# Altium footprint library TUNA_AL-CAP_Lib.PcbLib: 133 footprints (part 6 of 9)
Each footprint in its own frame and in the unit in brackets; x right, y up, seen from the top. Pads: shape width x height; smd on the part's side, far side on the other; paste and mask are expansions set on the pad; w line width, h text height; cw(c..) or ccw(c..) is an arc to the next point about the centre after c.
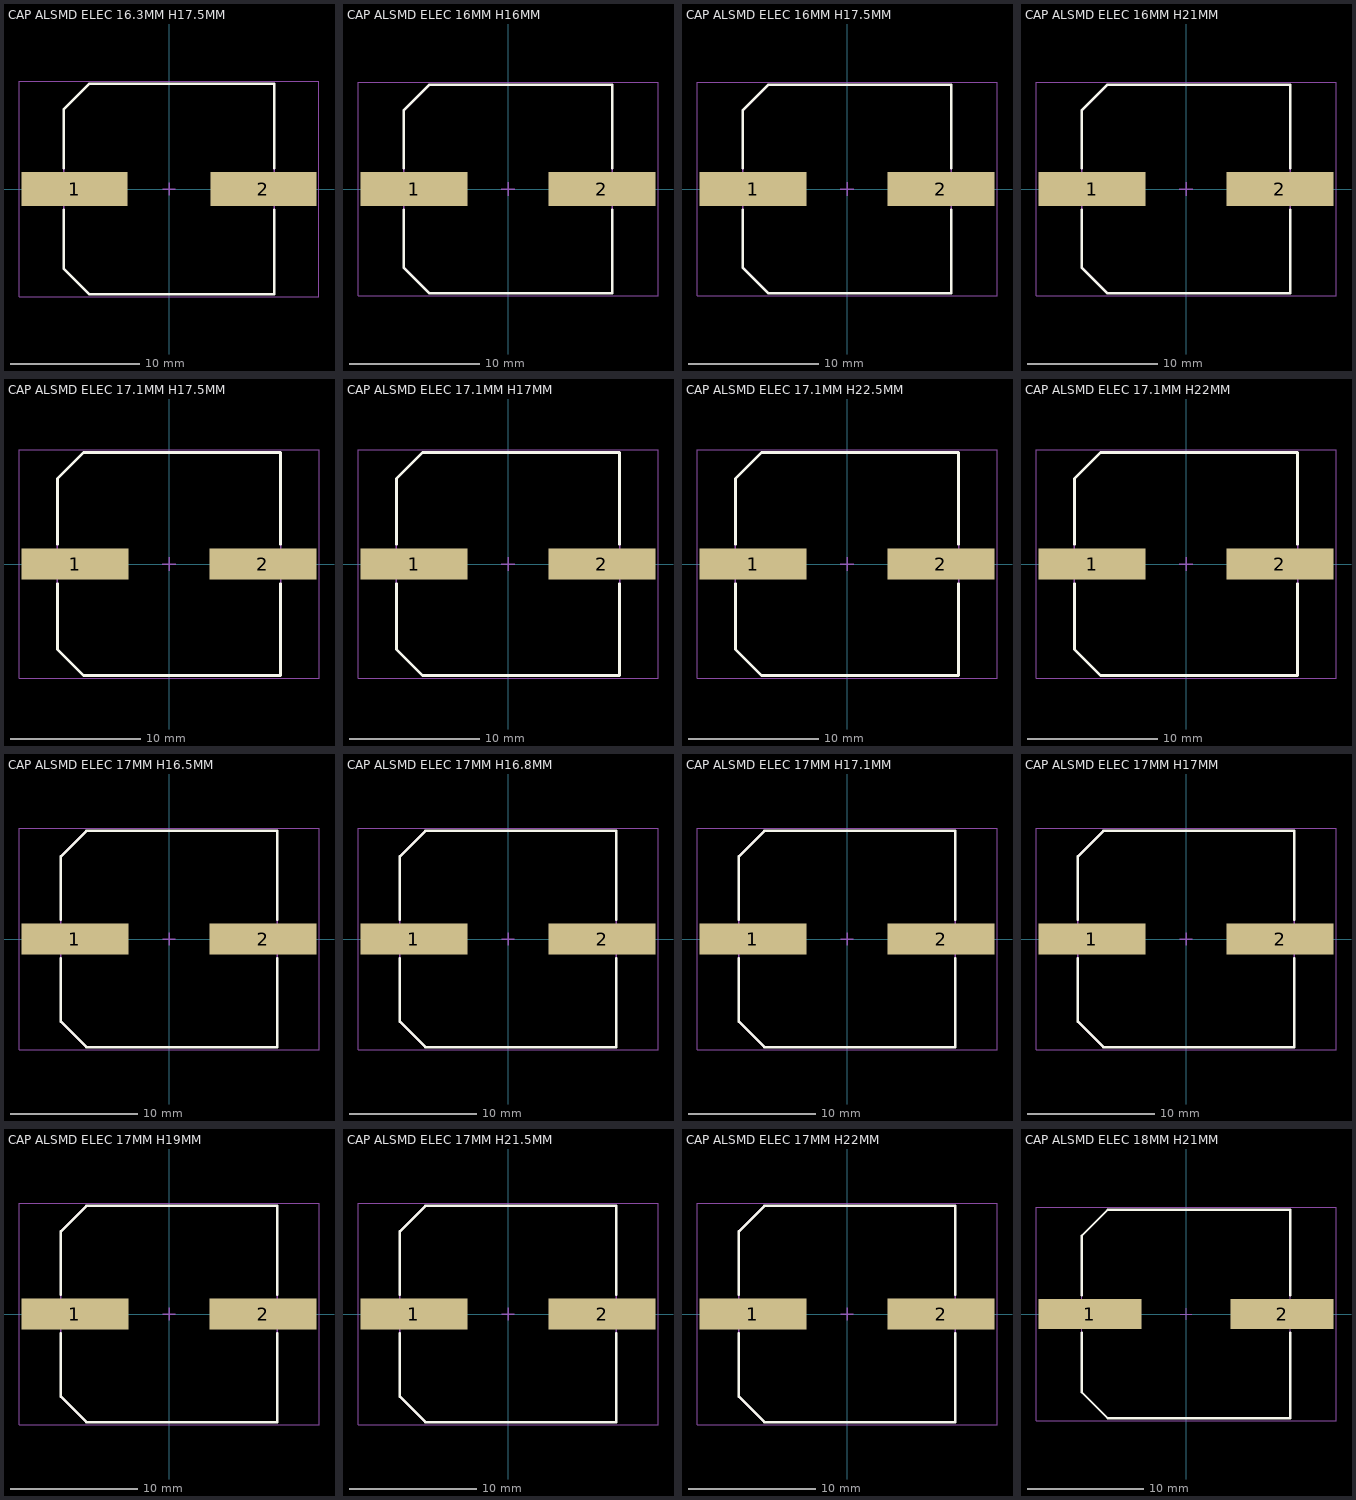
[diagram p5: the footprints below, top view; thin cyan lines are the x and y axes]

## CAP ALSMD ELEC 16.3MM H17.5MM [mm] "Aluminum SMD Electrolytic Capacitor, 16.30mm Land Size, 16.00mm Diameter, 17.50mm Height, 18.60mm Maximum Leads Span"
height 1.3
pads (2):
  rect 8.2x2.6 smd: 1(-7.3,0) 2(7.3,0)
Top Overlay:
  lines w0.2: -8.15,-1.6 -8.15,-6.15 -6.15,-8.15 8.15,-8.15 8.15,-1.6 ; -8.15,1.6 -8.15,6.15 -6.15,8.15 8.15,8.15 8.15,1.6
Mechanical 13:
  lines w0.1: -8.15,-6.15 -6.15,-8.15 8.15,-8.15 8.15,8.15 -6.15,8.15 -8.15,6.15 -8.15,-6.15
Mechanical 15:
  lines w0.05: -11.6,-8.35 11.6,-8.35 11.6,8.35 -11.6,8.35 -11.6,-8.35
  lines w0.1: -0.5,0 0.5,0 ; 0,-0.5 0,0.5
3D body ".STEP": height 17.5, standoff 0, extent -9.3,-8.15 9.3,8.15

## CAP ALSMD ELEC 16MM H16MM [mm] "Aluminum SMD Electrolytic Capacitor, 16.00mm Land Size, 16.00mm Diameter, 16.00mm Height, 18.60mm Maximum Leads Span"
height 1.3
pads (2):
  rect 8.2x2.6 smd: 1(-7.2,0) 2(7.2,0)
Top Overlay:
  lines w0.2: -8,-1.6 -8,-6 -6,-8 8,-8 8,-1.6 ; -8,1.6 -8,6 -6,8 8,8 8,1.6
Mechanical 13:
  lines w0.1: -8,-6 -6,-8 8,-8 8,8 -6,8 -8,6 -8,-6
Mechanical 15:
  lines w0.05: -11.5,-8.2 11.5,-8.2 11.5,8.2 -11.5,8.2 -11.5,-8.2
  lines w0.1: -0.5,0 0.5,0 ; 0,-0.5 0,0.5
3D body ".STEP": height 16, standoff 0, extent -9.3,-8 9.3,8

## CAP ALSMD ELEC 16MM H17.5MM [mm] "Aluminum SMD Electrolytic Capacitor, 16.00mm Land Size, 16.00mm Diameter, 17.50mm Height, 18.60mm Maximum Leads Span"
height 1.3
pads (2):
  rect 8.2x2.6 smd: 1(-7.2,0) 2(7.2,0)
Top Overlay:
  lines w0.2: -8,-1.6 -8,-6 -6,-8 8,-8 8,-1.6 ; -8,1.6 -8,6 -6,8 8,8 8,1.6
Mechanical 13:
  lines w0.1: -8,-6 -6,-8 8,-8 8,8 -6,8 -8,6 -8,-6
Mechanical 15:
  lines w0.05: -11.5,-8.2 11.5,-8.2 11.5,8.2 -11.5,8.2 -11.5,-8.2
  lines w0.1: -0.5,0 0.5,0 ; 0,-0.5 0,0.5
3D body ".STEP": height 17.5, standoff 0, extent -9.3,-8 9.3,8

## CAP ALSMD ELEC 16MM H21MM [mm] "Aluminum SMD Electrolytic Capacitor, 16.00mm Land Size, 16.00mm Diameter, 21.00mm Height, 18.60mm Maximum Leads Span"
height 1.3
pads (2):
  rect 8.2x2.6 smd: 1(-7.2,0) 2(7.2,0)
Top Overlay:
  lines w0.2: -8,-1.6 -8,-6 -6,-8 8,-8 8,-1.6 ; -8,1.6 -8,6 -6,8 8,8 8,1.6
Mechanical 13:
  lines w0.1: -8,-6 -8,6 -6,8 8,8 8,-8 -6,-8 -8,-6
Mechanical 15:
  lines w0.05: -11.5,-8.2 -11.5,8.2 11.5,8.2 11.5,-8.2 -11.5,-8.2
  lines w0.1: -0.5,0 0.5,0 ; 0,-0.5 0,0.5
3D body ".STEP": height 21, standoff 0, extent -9.3,-8 9.3,8

## CAP ALSMD ELEC 17.1MM H17.5MM [mm] "Aluminum SMD Electrolytic Capacitor, 17.10mm Land Size, 16.00mm Diameter, 17.50mm Height, 18.30mm Maximum Leads Span"
height 1.2
pads (2):
  rect 8.2x2.4 smd: 1(-7.2,0) 2(7.2,0)
Top Overlay:
  lines w0.2: -8.55,-1.5 -8.55,-6.55 -6.55,-8.55 8.55,-8.55 8.55,-1.5 ; -8.55,1.5 -8.55,6.55 -6.55,8.55 8.55,8.55 8.55,1.5
Mechanical 13:
  lines w0.1: -8.55,-6.55 -6.55,-8.55 8.55,-8.55 8.55,8.55 -6.55,8.55 -8.55,6.55 -8.55,-6.55
Mechanical 15:
  lines w0.05: -11.5,-8.75 11.5,-8.75 11.5,8.75 -11.5,8.75 -11.5,-8.75
  lines w0.1: -0.5,0 0.5,0 ; 0,-0.5 0,0.5
3D body ".STEP": height 17.5, standoff 0, extent -9.15,-8.55 9.15,8.55

## CAP ALSMD ELEC 17.1MM H17MM [mm] "Aluminum SMD Electrolytic Capacitor, 17.10mm Land Size, 16.00mm Diameter, 17.00mm Height, 18.30mm Maximum Leads Span"
height 1.2
pads (2):
  rect 8.2x2.4 smd: 1(-7.2,0) 2(7.2,0)
Top Overlay:
  lines w0.2: -8.55,-1.5 -8.55,-6.55 -6.55,-8.55 8.55,-8.55 8.55,-1.5 ; -8.55,1.5 -8.55,6.55 -6.55,8.55 8.55,8.55 8.55,1.5
Mechanical 13:
  lines w0.1: -8.55,-6.55 -6.55,-8.55 8.55,-8.55 8.55,8.55 -6.55,8.55 -8.55,6.55 -8.55,-6.55
Mechanical 15:
  lines w0.05: -11.5,-8.75 11.5,-8.75 11.5,8.75 -11.5,8.75 -11.5,-8.75
  lines w0.1: -0.5,0 0.5,0 ; 0,-0.5 0,0.5
3D body ".STEP": height 17, standoff 0, extent -9.15,-8.55 9.15,8.55

## CAP ALSMD ELEC 17.1MM H22.5MM [mm] "Aluminum SMD Electrolytic Capacitor, 17.10mm Land Size, 16.00mm Diameter, 22.50mm Height, 18.30mm Maximum Leads Span"
height 1.2
pads (2):
  rect 8.2x2.4 smd: 1(-7.2,0) 2(7.2,0)
Top Overlay:
  lines w0.2: -8.55,-1.5 -8.55,-6.55 -6.55,-8.55 8.55,-8.55 8.55,-1.5 ; -8.55,1.5 -8.55,6.55 -6.55,8.55 8.55,8.55 8.55,1.5
Mechanical 13:
  lines w0.1: -8.55,-6.55 -6.55,-8.55 8.55,-8.55 8.55,8.55 -6.55,8.55 -8.55,6.55 -8.55,-6.55
Mechanical 15:
  lines w0.05: -11.5,-8.75 11.5,-8.75 11.5,8.75 -11.5,8.75 -11.5,-8.75
  lines w0.1: -0.5,0 0.5,0 ; 0,-0.5 0,0.5
3D body ".STEP": height 22.5, standoff 0, extent -9.15,-8.55 9.15,8.55

## CAP ALSMD ELEC 17.1MM H22MM [mm] "Aluminum SMD Electrolytic Capacitor, 17.10mm Land Size, 16.00mm Diameter, 22.00mm Height, 18.30mm Maximum Leads Span"
height 1.2
pads (2):
  rect 8.2x2.4 smd: 1(-7.2,0) 2(7.2,0)
Top Overlay:
  lines w0.2: -8.55,-1.5 -8.55,-6.55 -6.55,-8.55 8.55,-8.55 8.55,-1.5 ; -8.55,1.5 -8.55,6.55 -6.55,8.55 8.55,8.55 8.55,1.5
Mechanical 13:
  lines w0.1: -8.55,-6.55 -6.55,-8.55 8.55,-8.55 8.55,8.55 -6.55,8.55 -8.55,6.55 -8.55,-6.55
Mechanical 15:
  lines w0.05: -11.5,-8.75 11.5,-8.75 11.5,8.75 -11.5,8.75 -11.5,-8.75
  lines w0.1: -0.5,0 0.5,0 ; 0,-0.5 0,0.5
3D body ".STEP": height 22, standoff 0, extent -9.15,-8.55 9.15,8.55

## CAP ALSMD ELEC 17MM H16.5MM [mm] "Aluminum SMD Electrolytic Capacitor, 17.00mm Land Size, 16.00mm Diameter, 16.50mm Height, 19.00mm Maximum Leads Span"
height 1.2
pads (2):
  rect 8.4x2.4 smd: 1(-7.4,0) 2(7.4,0)
Top Overlay:
  lines w0.2: -8.5,-1.5 -8.5,-6.5 -6.5,-8.5 8.5,-8.5 8.5,-1.5 ; -8.5,1.5 -8.5,6.5 -6.5,8.5 8.5,8.5 8.5,1.5
Mechanical 13:
  lines w0.1: -8.5,-6.5 -8.5,6.5 -6.5,8.5 8.5,8.5 8.5,-8.5 -6.5,-8.5 -8.5,-6.5
Mechanical 15:
  lines w0.05: -11.8,-8.7 -11.8,8.7 11.8,8.7 11.8,-8.7 -11.8,-8.7
  lines w0.1: -0.5,0 0.5,0 ; 0,-0.5 0,0.5
3D body ".STEP": height 16.5, standoff 0, extent -9.5,-8.5 9.5,8.5

## CAP ALSMD ELEC 17MM H16.8MM [mm] "Aluminum SMD Electrolytic Capacitor, 17.00mm Land Size, 16.00mm Diameter, 16.80mm Height, 19.00mm Maximum Leads Span"
height 1.2
pads (2):
  rect 8.4x2.4 smd: 1(-7.4,0) 2(7.4,0)
Top Overlay:
  lines w0.2: -8.5,-1.5 -8.5,-6.5 -6.5,-8.5 8.5,-8.5 8.5,-1.5 ; -8.5,1.5 -8.5,6.5 -6.5,8.5 8.5,8.5 8.5,1.5
Mechanical 13:
  lines w0.1: -8.5,-6.5 -6.5,-8.5 8.5,-8.5 8.5,8.5 -6.5,8.5 -8.5,6.5 -8.5,-6.5
Mechanical 15:
  lines w0.05: -11.8,-8.7 11.8,-8.7 11.8,8.7 -11.8,8.7 -11.8,-8.7
  lines w0.1: -0.5,0 0.5,0 ; 0,-0.5 0,0.5
3D body ".STEP": height 16.8, standoff 0, extent -9.5,-8.5 9.5,8.5

## CAP ALSMD ELEC 17MM H17.1MM [mm] "Aluminum SMD Electrolytic Capacitor, 17.00mm Land Size, 16.00mm Diameter, 17.10mm Height, 19.00mm Maximum Leads Span"
height 1.2
pads (2):
  rect 8.4x2.4 smd: 1(-7.4,0) 2(7.4,0)
Top Overlay:
  lines w0.2: -8.5,-1.5 -8.5,-6.5 -6.5,-8.5 8.5,-8.5 8.5,-1.5 ; -8.5,1.5 -8.5,6.5 -6.5,8.5 8.5,8.5 8.5,1.5
Mechanical 13:
  lines w0.1: -8.5,-6.5 -6.5,-8.5 8.5,-8.5 8.5,8.5 -6.5,8.5 -8.5,6.5 -8.5,-6.5
Mechanical 15:
  lines w0.05: -11.8,-8.7 11.8,-8.7 11.8,8.7 -11.8,8.7 -11.8,-8.7
  lines w0.1: -0.5,0 0.5,0 ; 0,-0.5 0,0.5
3D body ".STEP": height 17.1, standoff 0, extent -9.5,-8.5 9.5,8.5

## CAP ALSMD ELEC 17MM H17MM [mm] "Aluminum SMD Electrolytic Capacitor, 17.00mm Land Size, 16.00mm Diameter, 17.00mm Height, 19.00mm Maximum Leads Span"
height 1.2
pads (2):
  rect 8.4x2.4 smd: 1(-7.4,0) 2(7.4,0)
Top Overlay:
  lines w0.2: -8.5,-1.5 -8.5,-6.5 -6.5,-8.5 8.5,-8.5 8.5,-1.5 ; -8.5,1.5 -8.5,6.5 -6.5,8.5 8.5,8.5 8.5,1.5
Mechanical 13:
  lines w0.1: -8.5,-6.5 -6.5,-8.5 8.5,-8.5 8.5,8.5 -6.5,8.5 -8.5,6.5 -8.5,-6.5
Mechanical 15:
  lines w0.05: -11.8,-8.7 11.8,-8.7 11.8,8.7 -11.8,8.7 -11.8,-8.7
  lines w0.1: -0.5,0 0.5,0 ; 0,-0.5 0,0.5
3D body ".STEP": height 17, standoff 0, extent -9.5,-8.5 9.5,8.5

## CAP ALSMD ELEC 17MM H19MM [mm] "Aluminum SMD Electrolytic Capacitor, 17.00mm Land Size, 16.00mm Diameter, 19.00mm Height, 19.00mm Maximum Leads Span"
height 1.2
pads (2):
  rect 8.4x2.4 smd: 1(-7.4,0) 2(7.4,0)
Top Overlay:
  lines w0.2: -8.5,-1.5 -8.5,-6.5 -6.5,-8.5 8.5,-8.5 8.5,-1.5 ; -8.5,1.5 -8.5,6.5 -6.5,8.5 8.5,8.5 8.5,1.5
Mechanical 13:
  lines w0.1: -8.5,-6.5 -6.5,-8.5 8.5,-8.5 8.5,8.5 -6.5,8.5 -8.5,6.5 -8.5,-6.5
Mechanical 15:
  lines w0.05: -11.8,-8.7 11.8,-8.7 11.8,8.7 -11.8,8.7 -11.8,-8.7
  lines w0.1: -0.5,0 0.5,0 ; 0,-0.5 0,0.5
3D body ".STEP": height 19, standoff 0, extent -9.5,-8.5 9.5,8.5

## CAP ALSMD ELEC 17MM H21.5MM [mm] "Aluminum SMD Electrolytic Capacitor, 17.00mm Land Size, 16.00mm Diameter, 21.50mm Height, 19.00mm Maximum Leads Span"
height 1.2
pads (2):
  rect 8.4x2.4 smd: 1(-7.4,0) 2(7.4,0)
Top Overlay:
  lines w0.2: -8.5,-1.5 -8.5,-6.5 -6.5,-8.5 8.5,-8.5 8.5,-1.5 ; -8.5,1.5 -8.5,6.5 -6.5,8.5 8.5,8.5 8.5,1.5
Mechanical 13:
  lines w0.1: -8.5,-6.5 -6.5,-8.5 8.5,-8.5 8.5,8.5 -6.5,8.5 -8.5,6.5 -8.5,-6.5
Mechanical 15:
  lines w0.05: -11.8,-8.7 11.8,-8.7 11.8,8.7 -11.8,8.7 -11.8,-8.7
  lines w0.1: -0.5,0 0.5,0 ; 0,-0.5 0,0.5
3D body ".STEP": height 21.5, standoff 0, extent -9.5,-8.5 9.5,8.5

## CAP ALSMD ELEC 17MM H22MM [mm] "Aluminum SMD Electrolytic Capacitor, 17.00mm Land Size, 16.00mm Diameter, 22.00mm Height, 19.00mm Maximum Leads Span"
height 1.2
pads (2):
  rect 8.4x2.4 smd: 1(-7.4,0) 2(7.4,0)
Top Overlay:
  lines w0.2: -8.5,-1.5 -8.5,-6.5 -6.5,-8.5 8.5,-8.5 8.5,-1.5 ; -8.5,1.5 -8.5,6.5 -6.5,8.5 8.5,8.5 8.5,1.5
Mechanical 13:
  lines w0.1: -8.5,-6.5 -8.5,6.5 -6.5,8.5 8.5,8.5 8.5,-8.5 -6.5,-8.5 -8.5,-6.5
Mechanical 15:
  lines w0.05: -11.8,-8.7 -11.8,8.7 11.8,8.7 11.8,-8.7 -11.8,-8.7
  lines w0.1: -0.5,0 0.5,0 ; 0,-0.5 0,0.5
3D body ".STEP": height 22, standoff 0, extent -9.5,-8.5 9.5,8.5

## CAP ALSMD ELEC 18MM H21MM [mm] "Aluminum SMD Electrolytic Capacitor, 18.00mm Land Size, 18.00mm Diameter, 21.00mm Height, 21.00mm Maximum Leads Span"
height 1.3
pads (2):
  rect 8.9x2.6 smd: 1(-8.3,0) 2(8.3,0)
Top Overlay:
  lines w0.2: -9,-1.6 -9,-6.75 -6.75,-9 9,-9 9,-1.6 ; -9,1.6 -9,6.75 -6.75,9 9,9 9,1.6
Mechanical 13:
  lines w0.1: -9,-6.75 -9,6.75 -6.75,9 9,9 9,-9 -6.75,-9 -9,-6.75
Mechanical 15:
  lines w0.05: -12.95,-9.2 -12.95,9.2 12.95,9.2 12.95,-9.2 -12.95,-9.2
  lines w0.1: -0.5,0 0.5,0 ; 0,-0.5 0,0.5
3D body ".STEP": height 21, standoff 0, extent -10.5,-9 10.5,9